# Altium schematic symbol library Diodes - TVS.SchLib: 5379 symbols (part 7 of 35)
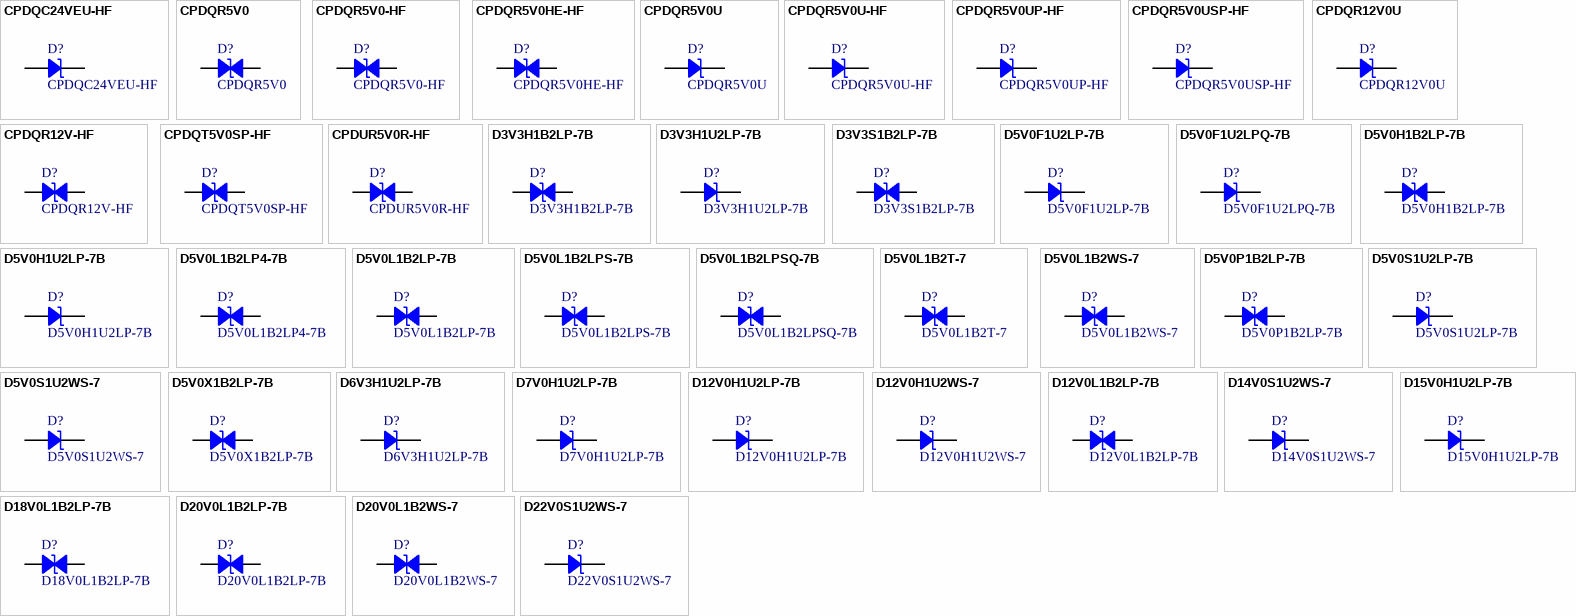
[diagram p140: symbols CPDQC24VEU-HF to D22V0S1U2WS-7]

## D5V0P1B2LP-7B
designator D?
TVS DIODE 5.5V 13V DFN1006-2; Manufacturer: Diodes Incorporated; Bidirectional Channels: 1; Capacitance @ Frequency: 8pF @ 1MHz; Current - Peak Pulse (10/1000µs): 4A (8/20µs); Power Line Protection: No; Type: Zener; Voltage - Breakdown (Min): 6V; Voltage - Reverse Standoff (Typ): 5.5V (Max); Part Number: D5V0P1B2LP-7B; Applications: General Purpose; ComponentLink1Description: Datasheet; ComponentLink1URL: https://www.diodes.com/assets/Datasheets/D5V0P1B2LP.pdf; ComponentLink2Description: DigiKey Link; ComponentLink2URL: http://digikey.com/product-detail/en/diodes-incorporated/D5V0P1B2LP-7B/D5V0P1B2LP-7BDICT-ND/4967047; Device Package: 0402 (1006 Metric); LastUpdated: 9/2/2020 1:28:49 AM; Lifecycle Status: Active; Minimum Order: 1; Mounting Type: Surface Mount; Operating Temperature: -65°C ~ 150°C (TJ); Package / Case: 0402 (1006 Metric); Packaging: TapeAndReel; PartId: 10503; Part Status: Active; Price: 0.03; Series: -; Supplier 1: DigiKey; Supplier Part Number 1: D5V0P1B2LP-7BDICT-ND; Supplier Device Package: X1-DFN1006-2; Voltage - Clamping (Max) @ Ipp: 13V
footprint 0402
pins: 1, 2

## D5V0S1U2LP-7B
designator D?
TRANSIENT VOLTAGE SUPPRESSOR PP; Manufacturer: Diodes Incorporated; Capacitance @ Frequency: 210pF @ 1MHz; Current - Peak Pulse (10/1000µs): 40A; Power Line Protection: No; Power - Peak Pulse: 500W; Type: Zener; Unidirectional Channels: 1; Voltage - Breakdown (Min): 6.2V; Voltage - Clamping (Max) @ Ipp: 13V; Voltage - Reverse Standoff (Typ): 5.5V (Max); Part Number: D5V0S1U2LP-7B; Applications: Automotive, HDMI, USB; ComponentLink2Description: DigiKey Link; ComponentLink2URL: http://digikey.com/product-detail/en/diodes-incorporated/D5V0S1U2LP-7B/31-D5V0S1U2LP-7BCT-ND/11643330; LastUpdated: 8/30/2020 9:08:09 PM; Lifecycle Status: Active; Minimum Order: 1; Mounting Type: Surface Mount; Operating Temperature: -65°C ~ 150°C (TJ); Package / Case: 0402 (1006 Metric); Packaging: CutTape; PartId: 11496; Price: 0.28; Series: Automotive, AEC-Q101; Supplier 1: DigiKey; Supplier Part Number 1: 31-D5V0S1U2LP-7BCT-ND; Supplier Device Package: X1-DFN1006-2
footprint 0402
pins: 1, 2

## D5V0S1U2WS-7
designator D?
TVS DIODE 5.5V 16V SOD323; Manufacturer: Diodes Incorporated; Capacitance @ Frequency: 950pF @ 1MHz; Current - Peak Pulse (10/1000µs): 70A (8/20µs); Power Line Protection: No; Power - Peak Pulse: 1000W (1kW); Type: Zener; Unidirectional Channels: 1; Voltage - Breakdown (Min): 6.2V; Voltage - Reverse Standoff (Typ): 5.5V (Max); Part Number: D5V0S1U2WS-7; Applications: Automotive; ComponentLink1Description: Datasheet; ComponentLink1URL: https://www.diodes.com/assets/Datasheets/D5V0S1U2WS.pdf; ComponentLink2Description: DigiKey Link; ComponentLink2URL: http://digikey.com/product-detail/en/diodes-incorporated/D5V0S1U2WS-7/31-D5V0S1U2WS-7CT-ND/11643340; LastUpdated: 8/30/2020 9:07:50 PM; Lifecycle Status: Active; Minimum Order: 1; Mounting Type: Surface Mount; Package / Case: SC-76, SOD-323; Packaging: CutTape; PartId: 11491; Price: 0.37; Series: Automotive, AEC-Q101; Supplier 1: DigiKey; Supplier Part Number 1: 31-D5V0S1U2WS-7CT-ND; Supplier Device Package: SOD-323; Voltage - Clamping (Max) @ Ipp: 16V
footprint SOD323
pins: 1, 2

## D5V0X1B2LP-7B
designator D?
TVS DIODE 5.5V 14V DFN1006-2; Manufacturer: Diodes Incorporated; Bidirectional Channels: 1; Capacitance @ Frequency: 0.3pF @ 1MHz; Current - Peak Pulse (10/1000µs): 1.5A (8/20µs); Power Line Protection: No; Type: Zener; Voltage - Breakdown (Min): 7V; Voltage - Reverse Standoff (Typ): 5.5V (Max); Part Number: D5V0X1B2LP-7B; Applications: General Purpose; ComponentLink1Description: Datasheet; ComponentLink1URL: https://www.diodes.com/assets/Datasheets/D5V0X1B2LP.pdf; ComponentLink2Description: DigiKey Link; ComponentLink2URL: http://digikey.com/product-detail/en/diodes-incorporated/D5V0X1B2LP-7B/D5V0X1B2LP-7BDICT-ND/4868993; Device Package: 0402 (1006 Metric); LastUpdated: 9/2/2020 1:28:49 AM; Lifecycle Status: Active; Minimum Order: 1; Mounting Type: Surface Mount; Operating Temperature: -65°C ~ 150°C (TJ); Package / Case: 0402 (1006 Metric); Packaging: TapeAndReel; PartId: 10492; Part Status: Active; Price: 0.07; Series: -; Supplier 1: DigiKey; Supplier Part Number 1: D5V0X1B2LP-7BDICT-ND; Supplier Device Package: X1-DFN1006-2; Voltage - Clamping (Max) @ Ipp: 14V
footprint 0402
pins: 1, 2

## D6V3H1U2LP-7B
designator D?
TVS DIODE 6.3V 12.5V DFN1006-2; Manufacturer: Diodes Incorporated; Capacitance @ Frequency: 200pF @ 1MHz; Current - Peak Pulse (10/1000µs): 30A (8/20µs); Power Line Protection: No; Power - Peak Pulse: 375W; Type: Zener; Unidirectional Channels: 1; Voltage - Breakdown (Min): 6.5V; Voltage - Reverse Standoff (Typ): 6.3V (Max); Part Number: D6V3H1U2LP-7B; Applications: General Purpose; ComponentLink1Description: Datasheet; ComponentLink1URL: https://www.diodes.com/assets/Datasheets/D6V3H1U2LP.pdf; ComponentLink2Description: DigiKey Link; ComponentLink2URL: http://digikey.com/product-detail/en/diodes-incorporated/D6V3H1U2LP-7B/D6V3H1U2LP-7BDICT-ND/7916705; Device Package: 0402 (1006 Metric); LastUpdated: 9/2/2020 1:28:45 AM; Lifecycle Status: Active; Minimum Order: 1; Mounting Type: Surface Mount; Operating Temperature: -65°C ~ 150°C (TJ); Package / Case: 0402 (1006 Metric); Packaging: TapeAndReel; PartId: 10396; Part Status: Active; Price: 0.04; Series: -; Supplier 1: DigiKey; Supplier Part Number 1: D6V3H1U2LP-7BDICT-ND; Supplier Device Package: X1-DFN1006-2; Voltage - Clamping (Max) @ Ipp: 12.5V
footprint 0402
pins: 1, 2

## D7V0H1U2LP-7B
designator D?
TRANSIENT VOLTAGE SUPPRESSOR PP; Manufacturer: Diodes Incorporated; Capacitance @ Frequency: 150pF @ 1MHz; Current - Peak Pulse (10/1000µs): 24A; Power Line Protection: No; Power - Peak Pulse: 270W; Type: Zener; Unidirectional Channels: 1; Voltage - Breakdown (Min): 7.5V; Voltage - Clamping (Max) @ Ipp: 14.4V; Voltage - Reverse Standoff (Typ): 7V (Max); Part Number: D7V0H1U2LP-7B; Applications: General Purpose; ComponentLink1Description: Datasheet; ComponentLink1URL: https://www.diodes.com/assets/Datasheets/D7V0H1U2LP.pdf; ComponentLink2Description: DigiKey Link; ComponentLink2URL: http://digikey.com/product-detail/en/diodes-incorporated/D7V0H1U2LP-7B/31-D7V0H1U2LP-7BCT-ND/10706920; Device Package: 0402 (1006 Metric); LastUpdated: 9/2/2020 1:28:45 AM; Lifecycle Status: Active; Minimum Order: 1; Mounting Type: Surface Mount; Operating Temperature: -65°C ~ 150°C (TJ); Package / Case: 0402 (1006 Metric); Packaging: TapeAndReel; PartId: 10365; Part Status: Active; Price: 0.05; Series: -; Supplier 1: DigiKey; Supplier Part Number 1: 31-D7V0H1U2LP-7BCT-ND; Supplier Device Package: X1-DFN1006-2
footprint 0402
pins: 1, 2

## D12V0H1U2LP-7B
designator D?
TVS DIODE 12V 23V DFN1006-2; Manufacturer: Diodes Incorporated; Capacitance @ Frequency: 80pF @ 1MHz; Current - Peak Pulse (10/1000µs): 13A (8/20µs); Power Line Protection: No; Power - Peak Pulse: 300W; Type: Zener; Unidirectional Channels: 1; Voltage - Breakdown (Min): 13.3V; Voltage - Reverse Standoff (Typ): 12V (Max); Part Number: D12V0H1U2LP-7B; Applications: General Purpose; ComponentLink1Description: Datasheet; ComponentLink1URL: https://www.diodes.com/assets/Datasheets/D12V0H1U2LP.pdf; ComponentLink2Description: DigiKey Link; ComponentLink2URL: http://digikey.com/product-detail/en/diodes-incorporated/D12V0H1U2LP-7B/D12V0H1U2LP-7BDICT-ND/4868975; Device Package: 0402 (1006 Metric); LastUpdated: 9/2/2020 1:28:45 AM; Lifecycle Status: Active; Minimum Order: 1; Mounting Type: Surface Mount; Operating Temperature: -65°C ~ 150°C (TJ); Package / Case: 0402 (1006 Metric); Packaging: TapeAndReel; PartId: 10399; Part Status: Active; Price: 0.08; Series: -; Supplier 1: DigiKey; Supplier Part Number 1: D12V0H1U2LP-7BDICT-ND; Supplier Device Package: X1-DFN1006-2; Voltage - Clamping (Max) @ Ipp: 23V
footprint 0402
pins: 1, 2

## D12V0H1U2WS-7
designator D?
TVS DIODE 12V 24V SOD323; Manufacturer: Diodes Incorporated; Capacitance @ Frequency: 180pF @ 1MHz; Current - Peak Pulse (10/1000µs): 25A (8/20µs); Power Line Protection: No; Power - Peak Pulse: 600W; Type: Zener; Unidirectional Channels: 1; Voltage - Breakdown (Min): 13.3V; Voltage - Reverse Standoff (Typ): 12V (Max); Part Number: D12V0H1U2WS-7; Applications: Automotive; ComponentLink1Description: Datasheet; ComponentLink1URL: https://www.diodes.com/assets/Datasheets/D12V0H1U2WS.pdf; ComponentLink2Description: DigiKey Link; ComponentLink2URL: http://digikey.com/product-detail/en/diodes-incorporated/D12V0H1U2WS-7/D12V0H1U2WS-7DICT-ND/4747620; LastUpdated: 9/2/2020 1:28:27 AM; Lifecycle Status: Active; Minimum Order: 1; Mounting Type: Surface Mount; Operating Temperature: -55°C ~ 125°C (TJ); Package / Case: SC-76, SOD-323; Packaging: TapeAndReel; PartId: 9863; Part Status: Active; Price: 0.09; Series: Automotive, AEC-Q101; Supplier 1: DigiKey; Supplier Part Number 1: D12V0H1U2WS-7DICT-ND; Supplier Device Package: SOD-323; Voltage - Clamping (Max) @ Ipp: 24V
footprint SOD323
pins: 1, 2

## D12V0L1B2LP-7B
designator D?
TVS DIODE 12V 25V DFN1006-2; Manufacturer: Diodes Incorporated; Bidirectional Channels: 1; Capacitance @ Frequency: 10pF @ 1MHz; Current - Peak Pulse (10/1000µs): 4A (8/20µs); Power Line Protection: No; Power - Peak Pulse: 100W; Type: Zener; Voltage - Breakdown (Min): 13V; Voltage - Reverse Standoff (Typ): 12V (Max); Part Number: D12V0L1B2LP-7B; Applications: Automotive; ComponentLink1Description: Datasheet; ComponentLink1URL: https://www.diodes.com/assets/Datasheets/D12V0L1B2LP.pdf; ComponentLink2Description: DigiKey Link; ComponentLink2URL: http://digikey.com/product-detail/en/diodes-incorporated/D12V0L1B2LP-7B/D12V0L1B2LP-7BDICT-ND/5033765; Device Package: 0402 (1006 Metric); LastUpdated: 9/2/2020 1:28:48 AM; Lifecycle Status: Active; Minimum Order: 1; Mounting Type: Surface Mount; Operating Temperature: -65°C ~ 150°C (TJ); Package / Case: 0402 (1006 Metric); Packaging: TapeAndReel; PartId: 10422; Part Status: Active; Price: 0.04; Series: Automotive, AEC-Q101; Supplier 1: DigiKey; Supplier Part Number 1: D12V0L1B2LP-7BDICT-ND; Supplier Device Package: X1-DFN1006-2; Voltage - Clamping (Max) @ Ipp: 25V
footprint 0402
pins: 1, 2

## D14V0S1U2WS-7
designator D?
TVS DIODE 14V 26V SOD323; Manufacturer: Diodes Incorporated; Capacitance @ Frequency: 360pF @ 1MHz; Current - Peak Pulse (10/1000µs): 50A (8/20µs); Power Line Protection: No; Power - Peak Pulse: 1300W (1.3kW); Type: Zener; Unidirectional Channels: 1; Voltage - Breakdown (Min): 14.5V; Voltage - Reverse Standoff (Typ): 14V (Max); Part Number: D14V0S1U2WS-7; Applications: General Purpose; ComponentLink1Description: Datasheet; ComponentLink1URL: https://www.diodes.com/assets/Datasheets/D14V0S1U2WS.pdf; ComponentLink2Description: DigiKey Link; ComponentLink2URL: http://digikey.com/product-detail/en/diodes-incorporated/D14V0S1U2WS-7/D14V0S1U2WS-7DICT-ND/5699720; LastUpdated: 9/2/2020 1:28:27 AM; Lifecycle Status: Active; Minimum Order: 1; Mounting Type: Surface Mount; Operating Temperature: -55°C ~ 125°C (TJ); Package / Case: SC-76, SOD-323; Packaging: CutTape; PartId: 9887; Part Status: Active; Price: 0.48; Series: -; Supplier 1: DigiKey; Supplier Part Number 1: D14V0S1U2WS-7DICT-ND; Supplier Device Package: SOD-323; Voltage - Clamping (Max) @ Ipp: 26V
footprint SOD323
pins: 1, 2

## D15V0H1U2LP-7B
designator D?
TVS PP X1-DFN1006-2; Manufacturer: Diodes Incorporated; Capacitance @ Frequency: 70pF @ 1MHz; Current - Peak Pulse (10/1000µs): 12A (8/20µs); Power Line Protection: No; Power - Peak Pulse: 300W; Type: Zener; Unidirectional Channels: 1; Voltage - Breakdown (Min): 16V; Voltage - Clamping (Max) @ Ipp: 27V; Voltage - Reverse Standoff (Typ): 15V (Max); Part Number: D15V0H1U2LP-7B; Applications: General Purpose; ComponentLink1Description: Datasheet; ComponentLink1URL: https://www.diodes.com/assets/Datasheets/D15V0H1U2LP.pdf; ComponentLink2Description: DigiKey Link; ComponentLink2URL: http://digikey.com/product-detail/en/diodes-incorporated/D15V0H1U2LP-7B/D15V0H1U2LP-7BDICT-ND/9089787; Device Package: 0402 (1006 Metric); LastUpdated: 9/2/2020 1:28:45 AM; Lifecycle Status: Active; Minimum Order: 1; Mounting Type: Surface Mount; Operating Temperature: -65°C ~ 150°C (TJ); Package / Case: 0402 (1006 Metric); Packaging: TapeAndReel; PartId: 10395; Part Status: Active; Price: 0.05; Series: -; Supplier 1: DigiKey; Supplier Part Number 1: D15V0H1U2LP-7BDICT-ND; Supplier Device Package: X1-DFN1006-2
footprint 0402
pins: 1, 2

## D18V0L1B2LP-7B
designator D?
TVS DIODE 18V 34V DFN1006-2; Manufacturer: Diodes Incorporated; Bidirectional Channels: 1; Capacitance @ Frequency: 7pF @ 1MHz; Current - Peak Pulse (10/1000µs): 2A (8/20µs); Power Line Protection: No; Power - Peak Pulse: 68W; Type: Zener; Voltage - Breakdown (Min): 21V; Voltage - Reverse Standoff (Typ): 18V (Max); Part Number: D18V0L1B2LP-7B; Applications: Automotive; ComponentLink1Description: Datasheet; ComponentLink1URL: https://www.diodes.com/assets/Datasheets/D18V0L1B2LP.pdf; ComponentLink2Description: DigiKey Link; ComponentLink2URL: http://digikey.com/product-detail/en/diodes-incorporated/D18V0L1B2LP-7B/31-D18V0L1B2LP-7BCT-ND/11643358; LastUpdated: 8/30/2020 9:08:11 PM; Lifecycle Status: Active; Minimum Order: 1; Mounting Type: Surface Mount; Package / Case: 0402 (1006 Metric); Packaging: CutTape; PartId: 11463; Price: 0.37; Series: Automotive, AEC-Q101; Supplier 1: DigiKey; Supplier Part Number 1: 31-D18V0L1B2LP-7BCT-ND; Supplier Device Package: X1-DFN1006-2; Voltage - Clamping (Max) @ Ipp: 34V
footprint 0402
pins: 1, 2

## D20V0L1B2LP-7B
designator D?
TVS DIODE 20V 34V DFN1006-2; Manufacturer: Diodes Incorporated; Bidirectional Channels: 1; Capacitance @ Frequency: 7pF @ 1MHz; Current - Peak Pulse (10/1000µs): 2A (8/20µs); Power Line Protection: No; Power - Peak Pulse: 68W; Type: Zener; Voltage - Breakdown (Min): 21V; Voltage - Reverse Standoff (Typ): 20V (Max); Part Number: D20V0L1B2LP-7B; Applications: Automotive; ComponentLink1Description: Datasheet; ComponentLink1URL: https://www.diodes.com/assets/Datasheets/D20V0L1B2LP.pdf; ComponentLink2Description: DigiKey Link; ComponentLink2URL: http://digikey.com/product-detail/en/diodes-incorporated/D20V0L1B2LP-7B/D20V0L1B2LP-7BDICT-ND/6052571; Device Package: 0402 (1006 Metric); LastUpdated: 9/2/2020 1:28:49 AM; Lifecycle Status: Active; Minimum Order: 1; Mounting Type: Surface Mount; Operating Temperature: -65°C ~ 150°C (TJ); Package / Case: 0402 (1006 Metric); Packaging: TapeAndReel; PartId: 10452; Part Status: Active; Price: 0.03; Series: Automotive, AEC-Q101; Supplier 1: DigiKey; Supplier Part Number 1: D20V0L1B2LP-7BDICT-ND; Supplier Device Package: X1-DFN1006-2; Voltage - Clamping (Max) @ Ipp: 34V
footprint 0402
pins: 1, 2

## D20V0L1B2WS-7
designator D?
TVS DIODE 20V 30V SOD323; Manufacturer: Diodes Incorporated; Bidirectional Channels: 1; Capacitance @ Frequency: 10pF @ 1MHz; Current - Peak Pulse (10/1000µs): 3A (8/20µs); Power Line Protection: No; Power - Peak Pulse: 90W; Type: Zener; Voltage - Breakdown (Min): 21V; Voltage - Reverse Standoff (Typ): 20V (Max); Part Number: D20V0L1B2WS-7; Applications: General Purpose; ComponentLink1Description: Datasheet; ComponentLink1URL: https://www.diodes.com/assets/Datasheets/D20V0L1B2WS.pdf; ComponentLink2Description: DigiKey Link; ComponentLink2URL: http://digikey.com/product-detail/en/diodes-incorporated/D20V0L1B2WS-7/D20V0L1B2WS-7DICT-ND/4251587; LastUpdated: 9/2/2020 1:28:29 AM; Lifecycle Status: Active; Minimum Order: 1; Mounting Type: Surface Mount; Operating Temperature: -65°C ~ 150°C (TJ); Package / Case: SC-76, SOD-323; Packaging: TapeAndReel; PartId: 9932; Part Status: Active; Price: 0.08; Series: -; Supplier 1: DigiKey; Supplier Part Number 1: D20V0L1B2WS-7DICT-ND; Supplier Device Package: SOD-323; Voltage - Clamping (Max) @ Ipp: 30V
footprint SOD323
pins: 1, 2

## D22V0S1U2WS-7
designator D?
TVS DIODE 22V 37V SOD323; Manufacturer: Diodes Incorporated; Capacitance @ Frequency: 220pF @ 1MHz; Current - Peak Pulse (10/1000µs): 30A (8/20µs); Power Line Protection: No; Power - Peak Pulse: 1000W (1kW); Type: Zener; Unidirectional Channels: 1; Voltage - Breakdown (Min): 24V; Voltage - Reverse Standoff (Typ): 22V (Max); Part Number: D22V0S1U2WS-7; Applications: General Purpose; ComponentLink1Description: Datasheet; ComponentLink1URL: https://www.diodes.com/assets/Datasheets/D22V0S1U2WS.pdf; ComponentLink2Description: DigiKey Link; ComponentLink2URL: http://digikey.com/product-detail/en/diodes-incorporated/D22V0S1U2WS-7/D22V0S1U2WS-7DICT-ND/6010161; LastUpdated: 9/2/2020 1:28:27 AM; Lifecycle Status: Active; Minimum Order: 1; Mounting Type: Surface Mount; Operating Temperature: -55°C ~ 125°C (TJ); Package / Case: SC-76, SOD-323; Packaging: CutTape; PartId: 9906; Part Status: Active; Price: 0.36; Series: -; Supplier 1: DigiKey; Supplier Part Number 1: D22V0S1U2WS-7DICT-ND; Supplier Device Package: SOD-323; Voltage - Clamping (Max) @ Ipp: 37V
footprint SOD323
pins: 1, 2

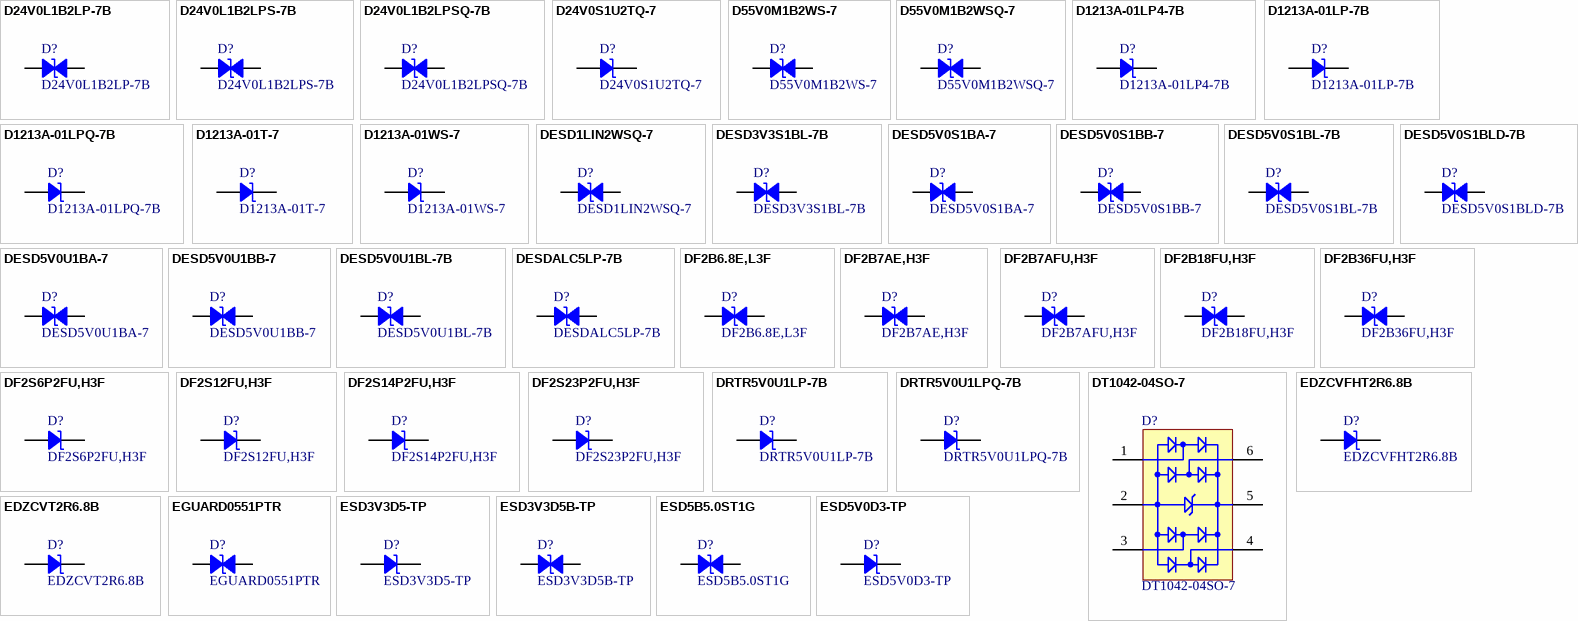
[diagram p23: symbols D24V0L1B2LP-7B to ESD5V0D3-TP]

## D24V0L1B2LP-7B
designator D?
TVS DIODE 24V 46V DFN1006-2; Manufacturer: Diodes Incorporated; Bidirectional Channels: 1; Capacitance @ Frequency: 6pF @ 1MHz; Current - Peak Pulse (10/1000µs): 2A (8/20µs); Power Line Protection: No; Power - Peak Pulse: 90W; Type: Zener; Voltage - Breakdown (Min): 26V; Voltage - Reverse Standoff (Typ): 24V (Max); Part Number: D24V0L1B2LP-7B; Applications: Automotive; ComponentLink1Description: Datasheet; ComponentLink1URL: https://www.diodes.com/assets/Datasheets/D24V0L1B2LP.pdf; ComponentLink2Description: DigiKey Link; ComponentLink2URL: http://digikey.com/product-detail/en/diodes-incorporated/D24V0L1B2LP-7B/D24V0L1B2LP-7BDICT-ND/6052572; Device Package: 0402 (1006 Metric); LastUpdated: 9/2/2020 1:28:49 AM; Lifecycle Status: Active; Minimum Order: 1; Mounting Type: Surface Mount; Operating Temperature: -65°C ~ 150°C (TJ); Package / Case: 0402 (1006 Metric); Packaging: TapeAndReel; PartId: 10465; Part Status: Active; Price: 0.06; Series: Automotive, AEC-Q101; Supplier 1: DigiKey; Supplier Part Number 1: D24V0L1B2LP-7BDICT-ND; Supplier Device Package: X1-DFN1006-2; Voltage - Clamping (Max) @ Ipp: 46V
footprint 0402
pins: 1, 2

## D24V0L1B2LPS-7B
designator D?
TVS DIODE 24V 46V DFN1006-2; Manufacturer: Diodes Incorporated; Bidirectional Channels: 1; Capacitance @ Frequency: 6pF @ 1MHz; Current - Peak Pulse (10/1000µs): 2A (8/20µs); Power Line Protection: No; Power - Peak Pulse: 90W; Type: Zener; Voltage - Breakdown (Min): 26V; Voltage - Reverse Standoff (Typ): 24V (Max); Part Number: D24V0L1B2LPS-7B; Applications: Automotive; ComponentLink1Description: Datasheet; ComponentLink1URL: https://www.diodes.com/assets/Datasheets/D24V0L1B2LPS.pdf; ComponentLink2Description: DigiKey Link; ComponentLink2URL: http://digikey.com/product-detail/en/diodes-incorporated/D24V0L1B2LPS-7B/D24V0L1B2LPS-7BDICT-ND/4747623; Device Package: 0402 (1006 Metric); LastUpdated: 9/2/2020 1:28:49 AM; Lifecycle Status: Active; Minimum Order: 1; Mounting Type: Surface Mount; Operating Temperature: -65°C ~ 150°C (TJ); Package / Case: 0402 (1006 Metric); Packaging: TapeAndReel; PartId: 10444; Part Status: Active; Price: 0.08; Series: Automotive, AEC-Q101; Supplier 1: DigiKey; Supplier Part Number 1: D24V0L1B2LPS-7BDICT-ND; Supplier Device Package: X1-DFN1006-2; Voltage - Clamping (Max) @ Ipp: 46V
footprint 0402
pins: 1, 2

## D24V0L1B2LPSQ-7B
designator D?
TVS DIODE 24V 46V DFN1006-2; Manufacturer: Diodes Incorporated; Bidirectional Channels: 1; Capacitance @ Frequency: 6pF @ 1MHz; Current - Peak Pulse (10/1000µs): 2A (8/20µs); Power Line Protection: No; Power - Peak Pulse: 90W; Type: Zener; Voltage - Breakdown (Min): 26V; Voltage - Reverse Standoff (Typ): 24V (Max); Part Number: D24V0L1B2LPSQ-7B; Applications: Automotive; ComponentLink1Description: Datasheet; ComponentLink1URL: https://www.diodes.com/assets/Datasheets/D24V0L1B2LPS.pdf; ComponentLink2Description: DigiKey Link; ComponentLink2URL: http://digikey.com/product-detail/en/diodes-incorporated/D24V0L1B2LPSQ-7B/D24V0L1B2LPSQ-7BDICT-ND/4810986; Device Package: 0402 (1006 Metric); LastUpdated: 9/2/2020 1:28:49 AM; Lifecycle Status: Active; Minimum Order: 1; Mounting Type: Surface Mount; Operating Temperature: -65°C ~ 150°C (TJ); Package / Case: 0402 (1006 Metric); Packaging: TapeAndReel; PartId: 10491; Part Status: Active; Price: 0.07; Series: Automotive, AEC-Q101; Supplier 1: DigiKey; Supplier Part Number 1: D24V0L1B2LPSQ-7BDICT-ND; Supplier Device Package: X1-DFN1006-2; Voltage - Clamping (Max) @ Ipp: 46V
footprint 0402
pins: 1, 2

## D24V0S1U2TQ-7
designator D?
GEN PROTECT PP SOD523; Manufacturer: Diodes Incorporated; Capacitance @ Frequency: 35pF @ 1MHz; Current - Peak Pulse (10/1000µs): 6A (8/20µs); Power Line Protection: No; Power - Peak Pulse: 360W; Type: Zener; Unidirectional Channels: 1; Voltage - Breakdown (Min): 27V; Voltage - Clamping (Max) @ Ipp: 36V; Voltage - Reverse Standoff (Typ): 24V (Max); Part Number: D24V0S1U2TQ-7; Applications: Automotive; ComponentLink1Description: Datasheet; ComponentLink1URL: https://www.diodes.com/assets/Datasheets/D24V0S1U2TQ.pdf; ComponentLink2Description: DigiKey Link; ComponentLink2URL: http://digikey.com/product-detail/en/diodes-incorporated/D24V0S1U2TQ-7/31-D24V0S1U2TQ-7CT-ND/10674221; LastUpdated: 9/2/2020 1:28:23 AM; Lifecycle Status: Active; Minimum Order: 1; Mounting Type: Surface Mount; Operating Temperature: -65°C ~ 150°C (TJ); Package / Case: SC-79, SOD-523; Packaging: TapeAndReel; PartId: 9718; Part Status: Active; Price: 0.06; Series: Automotive, AEC-Q101; Supplier 1: DigiKey; Supplier Part Number 1: 31-D24V0S1U2TQ-7CT-ND; Supplier Device Package: SOD-523
footprint SOD523F
pins: 1, 2

## D55V0M1B2WS-7
designator D?
TVS DIODE 55VWM 100VC; Manufacturer: Diodes Incorporated; Bidirectional Channels: 1; Capacitance @ Frequency: 14pF @ 1MHz; Current - Peak Pulse (10/1000µs): 2A (8/20µs); Power Line Protection: No; Power - Peak Pulse: 200W; Type: Zener; Voltage - Breakdown (Min): 57V; Voltage - Clamping (Max) @ Ipp: 100V; Voltage - Reverse Standoff (Typ): 55V (Max); Part Number: D55V0M1B2WS-7; Applications: General Purpose; ComponentLink1Description: Datasheet; ComponentLink1URL: https://www.diodes.com/assets/Datasheets/D55V0M1B2WS.pdf; ComponentLink2Description: DigiKey Link; ComponentLink2URL: http://digikey.com/product-detail/en/diodes-incorporated/D55V0M1B2WS-7/D55V0M1B2WS-7DICT-ND/8545864; LastUpdated: 9/2/2020 1:28:29 AM; Lifecycle Status: Active; Minimum Order: 1; Mounting Type: Surface Mount; Operating Temperature: -65°C ~ 150°C (TJ); Package / Case: SC-76, SOD-323; Packaging: TapeAndReel; PartId: 9930; Part Status: Active; Price: 0.08; Series: -; Supplier 1: DigiKey; Supplier Part Number 1: D55V0M1B2WS-7DICT-ND; Supplier Device Package: SOD-323
footprint SOD323
pins: 1, 2

## D55V0M1B2WSQ-7
designator D?
TVS DIODE PP SOD323; Manufacturer: Diodes Incorporated; Bidirectional Channels: 1; Capacitance @ Frequency: 14pF @ 1MHz; Current - Peak Pulse (10/1000µs): 2A (8/20µs); Power Line Protection: No; Power - Peak Pulse: 200W; Type: Zener; Voltage - Breakdown (Min): 57V; Voltage - Clamping (Max) @ Ipp: 100V; Voltage - Reverse Standoff (Typ): 55V (Max); Part Number: D55V0M1B2WSQ-7; Applications: Automotive, USB; ComponentLink1Description: Datasheet; ComponentLink1URL: https://www.diodes.com/assets/Datasheets/D55V0M1B2WSQ.pdf; ComponentLink2Description: DigiKey Link; ComponentLink2URL: http://digikey.com/product-detail/en/diodes-incorporated/D55V0M1B2WSQ-7/D55V0M1B2WSQ-7DICT-ND/9089791; LastUpdated: 9/2/2020 1:28:29 AM; Lifecycle Status: Active; Minimum Order: 1; Mounting Type: Surface Mount; Operating Temperature: -65°C ~ 150°C (TJ); Package / Case: SC-76, SOD-323; Packaging: TapeAndReel; PartId: 9984; Part Status: Active; Price: 0.11; Series: Automotive, AEC-Q101; Supplier 1: DigiKey; Supplier Part Number 1: D55V0M1B2WSQ-7DICT-ND; Supplier Device Package: SOD-323
footprint SOD323
pins: 1, 2

## D1213A-01LP4-7B
designator D?
TVS DIODE 3.3V 10V DFN1006-2; Manufacturer: Diodes Incorporated; Current - Peak Pulse (10/1000µs): 1A (8/20µs); Power Line Protection: No; Type: Zener; Unidirectional Channels: 1; Voltage - Breakdown (Min): 6V; Voltage - Clamping (Max) @ Ipp: 10V (Typ); Voltage - Reverse Standoff (Typ): 3.3V (Max); Part Number: D1213A-01LP4-7B; Applications: Automotive; ComponentLink1Description: Datasheet; ComponentLink1URL: https://www.diodes.com/assets/Datasheets/D1213A-01LP4.pdf; ComponentLink2Description: DigiKey Link; ComponentLink2URL: http://digikey.com/product-detail/en/diodes-incorporated/D1213A-01LP4-7B/D1213A-01LP4-7BDICT-ND/3340429; Device Package: 0402 (1006 Metric); LastUpdated: 9/2/2020 1:28:45 AM; Lifecycle Status: Active; Minimum Order: 1; Mounting Type: Surface Mount; Operating Temperature: -65°C ~ 150°C (TJ); Package / Case: 0402 (1006 Metric); Packaging: TapeAndReel; PartId: 10369; Part Status: Active; Price: 0.05; Series: Automotive, AEC-Q101; Supplier 1: DigiKey; Supplier Part Number 1: D1213A-01LP4-7BDICT-ND; Supplier Device Package: X2-DFN1006-2
footprint 0402
pins: 1, 2

## D1213A-01LP-7B
designator D?
TVS DIODE 3.3V 10V DFN1006-2; Manufacturer: Diodes Incorporated; Current - Peak Pulse (10/1000µs): 1A (8/20µs); Power Line Protection: No; Type: Zener; Unidirectional Channels: 1; Voltage - Breakdown (Min): 6V; Voltage - Clamping (Max) @ Ipp: 10V (Typ); Voltage - Reverse Standoff (Typ): 3.3V (Max); Part Number: D1213A-01LP-7B; Applications: Automotive; ComponentLink1Description: Datasheet; ComponentLink1URL: https://www.diodes.com/assets/Datasheets/D1213A-01LP.pdf; ComponentLink2Description: DigiKey Link; ComponentLink2URL: http://digikey.com/product-detail/en/diodes-incorporated/D1213A-01LP-7B/D1213A-01LP-7BDICT-ND/3340425; Device Package: 0402 (1006 Metric); LastUpdated: 9/2/2020 1:28:45 AM; Lifecycle Status: Active; Minimum Order: 1; Mounting Type: Surface Mount; Operating Temperature: -65°C ~ 150°C (TJ); Package / Case: 0402 (1006 Metric); Packaging: TapeAndReel; PartId: 10383; Part Status: Active; Price: 0.05; Series: Automotive, AEC-Q101; Supplier 1: DigiKey; Supplier Part Number 1: D1213A-01LP-7BDICT-ND; Supplier Device Package: X1-DFN1006-2
footprint 0402
pins: 1, 2

## D1213A-01LPQ-7B
designator D?
TVS DIODE 3.3V 10V DFN1006-2; Manufacturer: Diodes Incorporated; Capacitance @ Frequency: 0.85pF @ 1MHz; Current - Peak Pulse (10/1000µs): 5A (8/20µs); Power Line Protection: No; Type: Steering (Rail to Rail); Unidirectional Channels: 1; Voltage - Breakdown (Min): 6V; Voltage - Reverse Standoff (Typ): 3.3V (Max); Part Number: D1213A-01LPQ-7B; Applications: Automotive; ComponentLink1Description: Datasheet; ComponentLink1URL: https://www.diodes.com/assets/Datasheets/D1213A-01LPQ.pdf; ComponentLink2Description: DigiKey Link; ComponentLink2URL: http://digikey.com/product-detail/en/diodes-incorporated/D1213A-01LPQ-7B/31-D1213A-01LPQ-7BCT-ND/11643316; LastUpdated: 8/30/2020 9:08:09 PM; Lifecycle Status: Active; Minimum Order: 1; Mounting Type: Surface Mount; Operating Temperature: -55°C ~ 150°C (TJ); Package / Case: 0402 (1006 Metric); Packaging: TapeAndReel; PartId: 11494; Price: 0.07; Series: Automotive, AEC-Q101; Supplier 1: DigiKey; Supplier Part Number 1: 31-D1213A-01LPQ-7BCT-ND; Supplier Device Package: X1-DFN1006-2; Voltage - Clamping (Max) @ Ipp: 10V
footprint 0402
pins: 1, 2

## D1213A-01T-7
designator D?
TVS DIODE 3.3V 10V SOD523; Manufacturer: Diodes Incorporated; Current - Peak Pulse (10/1000µs): 1A (8/20µs); Power Line Protection: No; Type: Zener; Unidirectional Channels: 1; Voltage - Breakdown (Min): 6V; Voltage - Clamping (Max) @ Ipp: 10V (Typ); Voltage - Reverse Standoff (Typ): 3.3V (Max); Part Number: D1213A-01T-7; Applications: Automotive; ComponentLink1Description: Datasheet; ComponentLink1URL: https://www.diodes.com/assets/Datasheets/D1213A-01T.pdf; ComponentLink2Description: DigiKey Link; ComponentLink2URL: http://digikey.com/product-detail/en/diodes-incorporated/D1213A-01T-7/D1213A-01T-7DICT-ND/3340434; LastUpdated: 9/2/2020 1:28:24 AM; Lifecycle Status: Active; Minimum Order: 1; Mounting Type: Surface Mount; Operating Temperature: -65°C ~ 150°C (TJ); Package / Case: SC-79, SOD-523; Packaging: TapeAndReel; PartId: 9777; Part Status: Active; Price: 0.07; Series: Automotive, AEC-Q101; Supplier 1: DigiKey; Supplier Part Number 1: D1213A-01T-7DICT-ND; Supplier Device Package: SOD-523
footprint SOD523F
pins: 1, 2

## D1213A-01WS-7
designator D?
TVS DIODE 3.3V 10V SOD323; Manufacturer: Diodes Incorporated; Current - Peak Pulse (10/1000µs): 1A (8/20µs); Power Line Protection: No; Type: Zener; Unidirectional Channels: 1; Voltage - Breakdown (Min): 6V; Voltage - Clamping (Max) @ Ipp: 10V (Typ); Voltage - Reverse Standoff (Typ): 3.3V (Max); Part Number: D1213A-01WS-7; Applications: Automotive; ComponentLink1Description: Datasheet; ComponentLink1URL: https://www.diodes.com/assets/Datasheets/D1213A-01WS.pdf; ComponentLink2Description: DigiKey Link; ComponentLink2URL: http://digikey.com/product-detail/en/diodes-incorporated/D1213A-01WS-7/D1213A-01WS-7DICT-ND/3340438; LastUpdated: 9/2/2020 1:28:27 AM; Lifecycle Status: Active; Minimum Order: 1; Mounting Type: Surface Mount; Operating Temperature: -65°C ~ 150°C (TJ); Package / Case: SC-76, SOD-323; Packaging: TapeAndReel; PartId: 9879; Part Status: Active; Price: 0.06; Series: Automotive, AEC-Q101; Supplier 1: DigiKey; Supplier Part Number 1: D1213A-01WS-7DICT-ND; Supplier Device Package: SOD-323
footprint SOD323
pins: 1, 2

## DESD1LIN2WSQ-7
designator D?
TVS DIODE 24V 50V SOD323; Manufacturer: Diodes Incorporated; Bidirectional Channels: 1; Capacitance @ Frequency: 13pF @ 1MHz; Current - Peak Pulse (10/1000µs): 3A (8/20µs); Power Line Protection: No; Power - Peak Pulse: 160W; Type: Zener; Voltage - Breakdown (Min): 25.4V; Voltage - Reverse Standoff (Typ): 24V (Max); Part Number: DESD1LIN2WSQ-7; Applications: Automotive; ComponentLink1Description: Datasheet; ComponentLink1URL: https://www.diodes.com/assets/Datasheets/DESD1LIN2WSQ.pdf; ComponentLink2Description: DigiKey Link; ComponentLink2URL: http://digikey.com/product-detail/en/diodes-incorporated/DESD1LIN2WSQ-7/DESD1LIN2WSQ-7DICT-ND/5080362; LastUpdated: 8/30/2020 9:07:52 PM; Lifecycle Status: Active; Minimum Order: 1; Mounting Type: Surface Mount; Operating Temperature: -65°C ~ 150°C (TJ); Package / Case: SC-76, SOD-323; Packaging: CutTape; PartId: 11492; Price: 0.45; Series: Automotive, AEC-Q101; Supplier 1: DigiKey; Supplier Part Number 1: DESD1LIN2WSQ-7DICT-ND; Supplier Device Package: SOD-323; Voltage - Clamping (Max) @ Ipp: 50V
footprint SOD323
pins: 1, 2

## DESD3V3S1BL-7B
designator D?
TVS DIODE 3.3V 7V DFN1006-2; Manufacturer: Diodes Incorporated; Bidirectional Channels: 1; Capacitance @ Frequency: 10pF @ 1MHz; Current - Peak Pulse (10/1000µs): 5A (8/20µs); Power Line Protection: No; Power - Peak Pulse: 35W; Type: Zener; Voltage - Breakdown (Min): 3.8V; Voltage - Reverse Standoff (Typ): 3.3V (Max); Part Number: DESD3V3S1BL-7B; Applications: General Purpose; ComponentLink1Description: Datasheet; ComponentLink1URL: https://www.diodes.com/assets/Datasheets/DESD3V3S1BL.pdf; ComponentLink2Description: DigiKey Link; ComponentLink2URL: http://digikey.com/product-detail/en/diodes-incorporated/DESD3V3S1BL-7B/DESD3V3S1BL-7BDICT-ND/4567799; Device Package: 0402 (1006 Metric); LastUpdated: 9/2/2020 1:28:49 AM; Lifecycle Status: Active; Minimum Order: 1; Mounting Type: Surface Mount; Operating Temperature: -65°C ~ 150°C (TJ); Package / Case: 0402 (1006 Metric); Packaging: TapeAndReel; PartId: 10451; Part Status: Active; Price: 0.04; Series: -; Supplier 1: DigiKey; Supplier Part Number 1: DESD3V3S1BL-7BDICT-ND; Supplier Device Package: X1-DFN1006-2; Voltage - Clamping (Max) @ Ipp: 7V
footprint 0402
pins: 1, 2
